# Altium footprint library CONN_W2B.PcbLib: 77 footprints (part 1 of 5)
Each footprint in its own frame and in the unit in brackets; x right, y up, seen from the top. Pads: shape width x height; smd on the part's side, far side on the other; paste and mask are expansions set on the pad; w line width, h text height; cw(c..) or ccw(c..) is an arc to the next point about the centre after c.
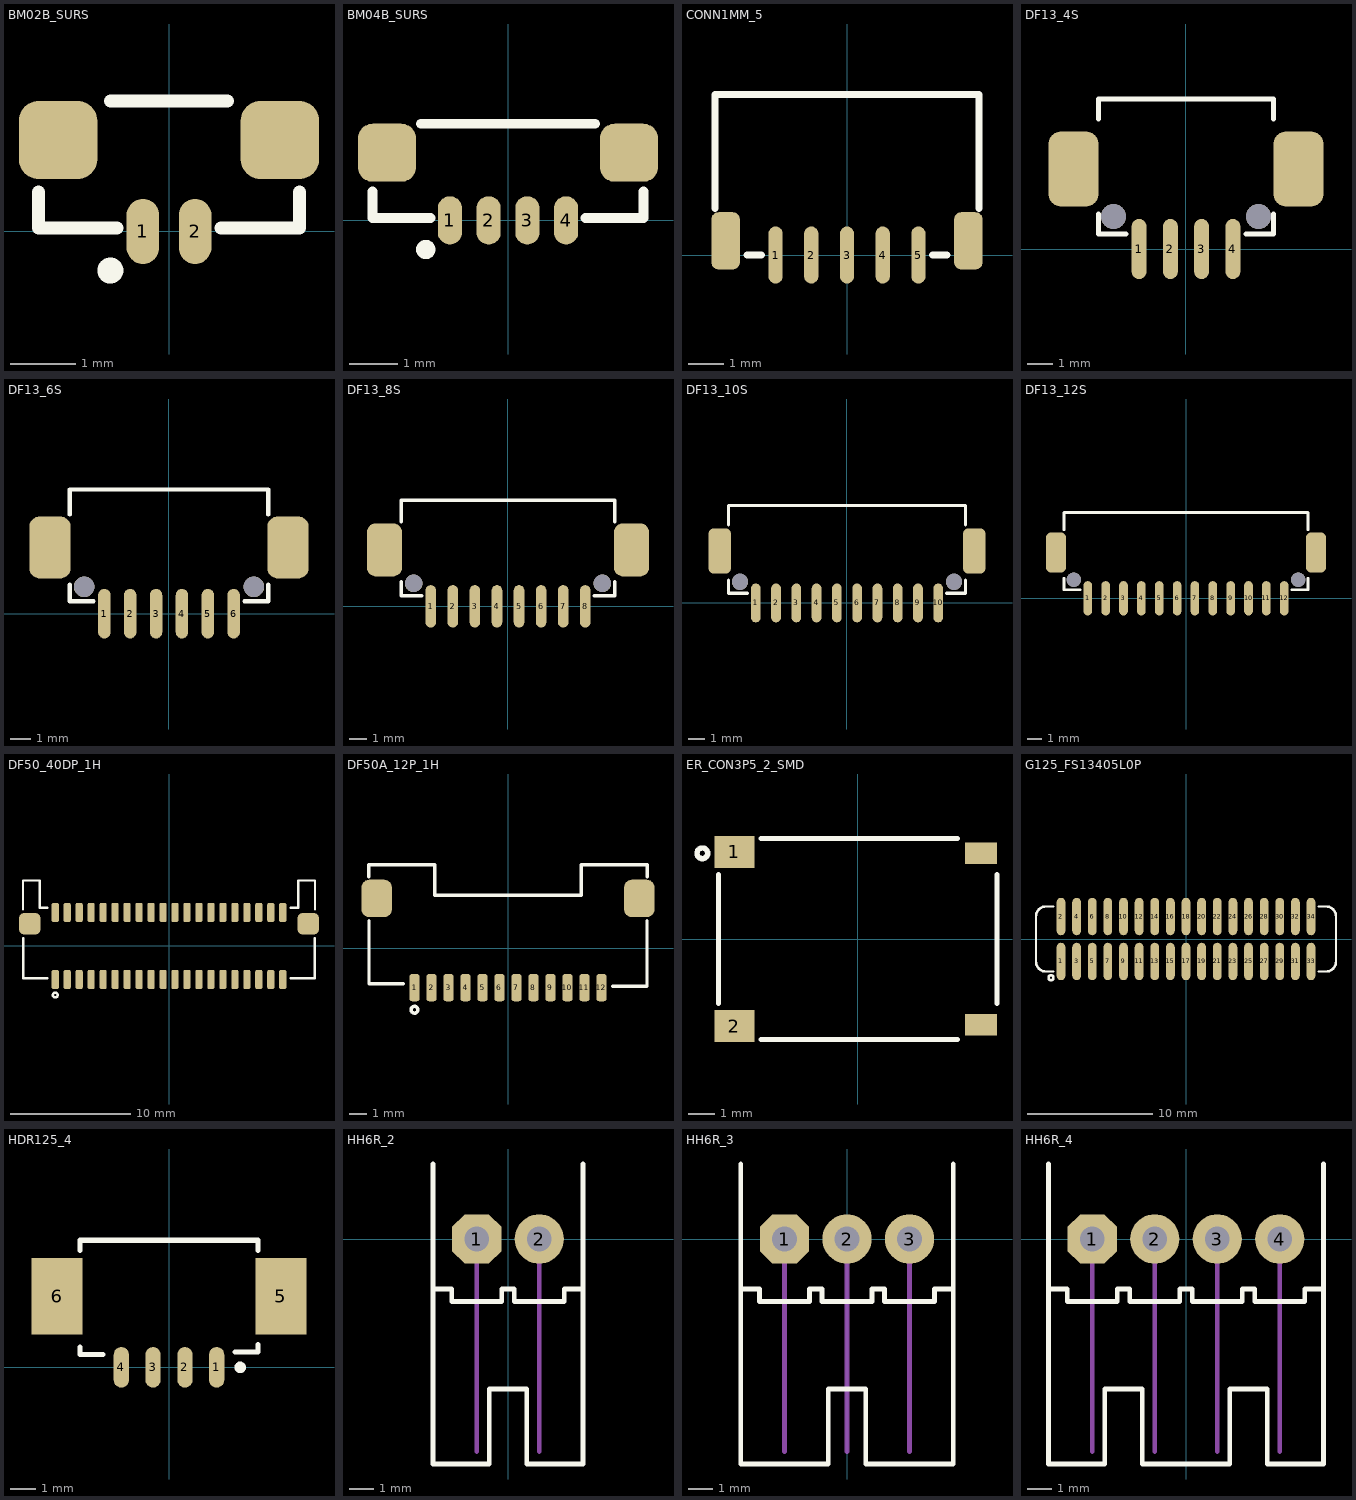
[diagram p0: the footprints below, top view; thin cyan lines are the x and y axes]

## BM02B_SURS [mm] "eSUR, Pitch: 0.8mm, Top Entry"
height 4
pads (4):
  oval 0.5x1 smd mask+0.075: 1(-0.4,0) 2(0.4,0)
  rrect50% 1.2x1.2 smd: ""(-1.7,1.4) ""(1.7,1.4)
Top Overlay:
  circle w0.2: c-0.9,-0.6 r0.1
  lines w0.2: -2,0.6 -2,0.05 -0.8,0.05 ; -0.9,2 0.9,2 ; 0.8,0.05 2,0.05 2,0.6
3D body "BM02B-SURS-TF.STEP": height 2.75, standoff 0, extent -1.9,-0.3 1.9,1.95

## BM04B_SURS [mm] "eSUR, Pitch: 0.8mm, Top Entry"
height 4
pads (6):
  oval 0.5x1 smd mask+0.075: 1(-1.2,0) 2(-0.4,0) 3(0.4,0) 4(1.2,0)
  rrect50% 1.2x1.2 smd: ""(-2.5,1.4) ""(2.5,1.4)
Top Overlay:
  circle w0.2: c-1.7,-0.6 r0.1
  lines w0.2: -2.8,0.6 -2.8,0.05 -1.6,0.05 ; -1.8,2 1.8,2 ; 1.6,0.05 2.8,0.05 2.8,0.6
3D body "BM04B-SURS-TF.STEP": height 2.75, standoff 0, extent -2.7,-0.3 2.7,1.95

## CONN1MM_5 [mm] "CONN, 1mm, SMT RA, TE 1734709-5"
height 3
pads (7):
  oval 0.4x1.6 smd: 1(-2,0) 2(-1,0) 3(0,0) 4(1,0) 5(2,0)
  rrect50% 0.8x1.6 smd: ""(-3.4,0.4) ""(3.4,0.4)
Top Overlay:
  lines w0.2: -3.7,1.3 -3.7,4.5 3.7,4.5 3.7,1.3 ; -2.8,0 -2.4,0 ; 2.4,0 2.8,0
3D body "c-1734709-5-b-3d.stp": height 2.95, standoff 0, extent -3.65,-0.55 3.65,4.4

## DF13_4S [mm] "Hirose Connector DF13-4P-1.25H, DF13 4WAY pitch:1.25mm"
height 3
pads (8):
  oval 0.6x2.4 smd: 1(-1.875,0) 2(-0.625,0) 3(0.625,0) 4(1.875,0)
  rrect50% 2x3 smd: ""(-4.5,3.2) ""(4.5,3.2)
  round 1 hole 1 unplated: ""(-2.9,1.3) ""(2.9,1.3)
Top Overlay:
  lines w0.2: -3.5,1.4 -3.5,0.6 -2.4,0.6 ; -3.5,5.2 -3.5,6 3.5,6 3.5,5.2 ; 2.4,0.6 3.5,0.6 3.5,1.4
3D body "DF13_4WAY.stp": height 3.58, standoff -0.82, extent -4.825,-0.6 4.825,5.9

## DF13_6S [mm] "Hirose Connector DF13-6P-1.25H, DF13 6WAY pitch:1.25mm"
height 3
pads (10):
  oval 0.6x2.4 smd: 1(-3.125,0) 2(-1.875,0) 3(-0.625,0) 4(0.625,0) 5(1.875,0) 6(3.125,0)
  rrect50% 2x3 smd: ""(-5.75,3.2) ""(5.75,3.2)
  round 1 hole 1 unplated: ""(-4.1,1.3) ""(4.1,1.3)
Top Overlay:
  lines w0.2: -4.8,1.4 -4.8,0.6 -3.65,0.6 ; -4.8,4.8 -4.8,6 4.8,6 4.8,4.8 ; 3.65,0.6 4.8,0.6 4.8,1.4
3D body "DF13_6WAY.stp": height 3.58, standoff -0.82, extent -6.075,-0.6 6.075,5.9

## DF13_8S [mm] "Hirose Connector DF13-8P-1.25H, pitch:1.25mm"
height 3
pads (12):
  oval 0.6x2.4 smd: 1(-4.375,0) 2(-3.125,0) 3(-1.875,0) 4(-0.625,0) 5(0.625,0) 6(1.875,0) 7(3.125,0) 8(4.375,0)
  rrect50% 2x3 smd: ""(-7,3.2) ""(7,3.2)
  round 1 hole 1 unplated: ""(-5.35,1.3) ""(5.35,1.3)
Top Overlay:
  lines w0.2: -6.05,1.4 -6.05,0.6 -4.9,0.6 ; -6.05,4.8 -6.05,6 6.05,6 6.05,4.8 ; 4.9,0.6 6.05,0.6 6.05,1.4
3D body "DF13-8P-1.25H.stp": height 3.58, standoff -0.82, extent -7.325,-0.6 7.325,5.9

## DF13_10S [mm] "Hirose Connector DF13-12P-1.25H, pitch:1.25mm"
height 3
pads (14):
  oval 0.6x2.4 smd: 1(-5.625,0) 2(-4.375,0) 3(-3.125,0) 4(-1.875,0) 5(-0.625,0) 6(0.625,0) 7(1.875,0) 8(3.125,0) 9(4.375,0) 10(5.625,0)
  rrect50% 1.4x2.8 smd: ""(-7.85,3.2) ""(7.85,3.2)
  round 1 hole 1 unplated: ""(-6.6,1.3) ""(6.6,1.3)
Top Overlay:
  lines w0.2: -7.3,1.4 -7.3,0.6 -6.15,0.6 ; -7.3,4.8 -7.3,6 7.3,6 7.3,4.8 ; 6.15,0.6 7.3,0.6 7.3,1.4
3D body "DF13-10P-1.25H.stp": height 3.58, standoff -0.82, extent -8.575,-0.6 8.575,5.9

## DF13_12S [mm] "Hirose Connector DF13-12P-1.25H, pitch:1.25mm"
height 3
pads (16):
  oval 0.6x2.4 smd: 1(-6.875,0) 2(-5.625,0) 3(-4.375,0) 4(-3.125,0) 5(-1.875,0) 6(-0.625,0) 7(0.625,0) 8(1.875,0) 9(3.125,0) 10(4.375,0) 11(5.625,0) 12(6.875,0)
  rrect50% 1.4x2.8 smd: ""(-9.1,3.2) ""(9.1,3.2)
  round 1 hole 1 unplated: ""(-7.85,1.3) ""(7.85,1.3)
Top Overlay:
  lines w0.2: -8.55,1.4 -8.55,0.6 -7.4,0.6 ; -8.55,4.8 -8.55,6 8.55,6 8.55,4.8 ; 7.4,0.6 8.55,0.6 8.55,1.4
3D body "DF13-12P-1.25H.stp": height 3.58, standoff -0.82, extent -9.825,-0.6 9.825,5.9

## DF50_40DP_1H [mm] "DF50-40DP-1H(51)"
height 1.6
pads (42):
  rrect50% 0.6x1.6 smd: 1(-9.5,-2.8) 2(-9.5,2.8) 3(-8.5,-2.8) 4(-8.5,2.8) 5(-7.5,-2.8) 6(-7.5,2.8) 7(-6.5,-2.8) 8(-6.5,2.8) 9(-5.5,-2.8) 10(-5.5,2.8) 11(-4.5,-2.8) 12(-4.5,2.8) 13(-3.5,-2.8) 14(-3.5,2.8) 15(-2.5,-2.8) 16(-2.5,2.8) 17(-1.5,-2.8) 18(-1.5,2.8) 19(-0.5,-2.8) 20(-0.5,2.8) 21(0.5,-2.8) 22(0.5,2.8) 23(1.5,-2.8) 24(1.5,2.8) 25(2.5,-2.8) 26(2.5,2.8) 27(3.5,-2.8) 28(3.5,2.8) 29(4.5,-2.8) 30(4.5,2.8) 31(5.5,-2.8) 32(5.5,2.8) 33(6.5,-2.8) 34(6.5,2.8) 35(7.5,-2.8) 36(7.5,2.8) 37(8.5,-2.8) 38(8.5,2.8) 39(9.5,-2.8) 40(9.5,2.8)
  rrect50% 1.8x1.8 smd: ""(-11.625,1.85) ""(11.625,1.85)
Top Overlay:
  circle w0.2: c-9.5,-4.1 r0.2
  lines w0.2: -12.192,3.048 -12.192,5.461 -10.795,5.461 -10.795,3.175 -10.16,3.175 ; -12.175,0.635 -12.175,-2.71 -10.16,-2.71 ; 10.16,-2.71 12.175,-2.71 12.175,0.635 ; 10.16,3.175 10.795,3.175 10.795,5.461 12.192,5.461 12.192,3.048
3D body "DF50-40DP-1H.stp": height 9.01, standoff 0.01, extent -12.175,-3.218 12.175,5.442

## DF50A_12P_1H [mm] "DF50A-12P-1H(51), 1mm pitch"
pads (14):
  rrect50% 0.6x1.6 smd: 1(-5.5,-2.325) 2(-4.5,-2.325) 3(-3.5,-2.325) 4(-2.5,-2.325) 5(-1.5,-2.325) 6(-0.5,-2.325) 7(0.5,-2.325) 8(1.5,-2.325) 9(2.5,-2.325) 10(3.5,-2.325) 11(4.5,-2.325) 12(5.5,-2.325)
  rrect50% 1.8x2.2 smd: ""(-7.725,2.925) ""(7.725,2.925)
Top Overlay:
  circle w0.2: c-5.5,-3.625 r0.2
  lines w0.2: -8.192,4.2 -8.192,4.9 -4.3,4.9 -4.3,3.1 4.3,3.1 4.3,4.9 8.192,4.9 8.192,4.2 ; -8.175,1.6 -8.175,-2.1 -6.16,-2.1 ; 6.16,-2.235 8.175,-2.235 8.175,1.6
3D body "DF50A-12P-1H.stp": height 6.07, standoff -0.01, extent -8.405,-2.8 8.405,4.8

## ER_CON3P5_2_SMD [mm] "ER-CON3.5-2P-SMD"
pads (4):
  rect 1.5x1.2 smd: 1(-4.6,3.25) 2(-4.6,-3.25)
  rect 1.2x0.8 smd: ""(4.6,-3.2) ""(4.6,3.2)
Top Overlay:
  circle w0.2: c-5.8,3.2 r0.2
  lines w0.2: -5.2,-2.4 -5.2,2.4 ; -3.6,-3.75 3.717,-3.75 ; -3.6,3.75 3.717,3.75 ; 5.2,-2.4 5.2,2.4
3D body: height 3.65, standoff 0, extent -5.25,-3.725 5.25,3.725

## G125_FS13405L0P [mm] "G125-FS13405L0P Harwin Gecko 1.25mm Female"
pads (34):
  oval 0.7x3 smd: 1(-10,-1.8) 2(-10,1.8) 3(-8.75,-1.8) 4(-8.75,1.8) 5(-7.5,-1.8) 6(-7.5,1.8) 7(-6.25,-1.8) 8(-6.25,1.8) 9(-5,-1.8) 10(-5,1.8) 11(-3.75,-1.8) 12(-3.75,1.8) 13(-2.5,-1.8) 14(-2.5,1.8) 15(-1.25,-1.8) 16(-1.25,1.8) 17(0,-1.8) 18(0,1.8) 19(1.25,-1.8) 20(1.25,1.8) 21(2.5,-1.8) 22(2.5,1.8) 23(3.75,-1.8) 24(3.75,1.8) 25(5,-1.8) 26(5,1.8) 27(6.25,-1.8) 28(6.25,1.8) 29(7.5,-1.8) 30(7.5,1.8) 31(8.75,-1.8) 32(8.75,1.8) 33(10,-1.8) 34(10,1.8)
Top Overlay:
  circle w0.2: c-10.8,-3.1 r0.2
  lines w0.2: -10.6,-2.6 -11.2,-2.6 cw(c-11.2,-1.8) -12,-1.8 -12,1.8 cw(c-11.2,1.8) -11.2,2.6 -10.6,2.6 ; 10.6,-2.6 11.2,-2.6 ccw(c11.2,-1.8) 12,-1.8 12,1.8 ccw(c11.2,1.8) 11.2,2.6 10.6,2.6
3D body "g125-fs13405l0_asm.stp": height 5.3, standoff -0.03, extent -11.9,-2.897 11.9,2.897

## HDR125_4 [mm] "CONN, HEADER, 1.25mm PITCH, MOLEX PicoBlade 0532610471"
pads (6):
  oval 0.6x1.6 smd: 1(1.875,0) 2(0.625,0) 3(-0.625,0) 4(-1.875,0)
  rect 2x3 smd: 5(4.4,2.8) 6(-4.4,2.8)
Top Overlay:
  circle w0.254: c2.8,0 r0.1
  lines w0.2: -3.5,0.8 -3.5,0.5 -2.6,0.5 ; -3.5,4.6 -3.5,5 3.5,5 3.5,4.6 ; 2.6,0.6 3.5,0.6 3.5,0.9
Mechanical 29:
  text ".Designator" at 3.6,-2.2 h1.52
3D body "532610471.stp": height 3.39, standoff -0.01, extent -5.075,-0.3 5.075,4.9

## HH6R_2 [mm]
pads (2):
  oct 2x2 hole 1: 1(-1.27,0)
  round 2 hole 1: 2(1.27,0)
Top Overlay:
  lines w0.2: -3.048,3.048 -3.048,-2.032 ; 3.048,3.048 3.048,-2.032 ; -3.048,-2.032 -3.048,-9.144 -0.762,-9.144 -0.762,-6.096 0.762,-6.096 0.762,-9.144 3.048,-9.144 3.048,-2.032 ; -3.048,-2.032 -2.286,-2.032 -2.286,-2.54 -0.254,-2.54 -0.254,-2.032 0.254,-2.032 0.254,-2.54 2.286,-2.54 2.286,-2.032 3.048,-2.032
Mechanical 5:
  lines w0.2: -1.27,-8.636 -1.27,0 ; 1.27,-8.636 1.27,0

## HH6R_3 [mm]
pads (3):
  oct 2x2 hole 1: 1(-2.54,0)
  round 2 hole 1: 2(0,0) 3(2.54,0)
Top Overlay:
  lines w0.2: -4.318,3.048 -4.318,-2.032 ; 4.318,3.048 4.318,-2.032 ; -4.318,-2.032 -3.556,-2.032 -3.556,-2.54 -1.524,-2.54 -1.524,-2.032 -1.016,-2.032 -1.016,-2.54 1.016,-2.54 1.016,-2.032 1.524,-2.032 1.524,-2.54 3.556,-2.54 3.556,-2.032 4.318,-2.032 ; -4.318,-2.032 -4.318,-9.144 -0.762,-9.144 -0.762,-6.096 0.762,-6.096 0.762,-9.144 4.318,-9.144 4.318,-2.032
Mechanical 5:
  lines w0.2: -2.54,-8.636 -2.54,0 ; 0,-8.636 0,0 ; 2.54,-8.636 2.54,0

## HH6R_4 [mm]
pads (4):
  oct 2x2 hole 1: 1(-3.81,0)
  round 2 hole 1: 2(-1.27,0) 3(1.27,0) 4(3.81,0)
Top Overlay:
  lines w0.2: -5.588,3.048 -5.588,-2.032 ; 5.588,3.048 5.588,-2.032 ; -5.588,-2.032 -4.826,-2.032 -4.826,-2.54 -2.794,-2.54 -2.794,-2.032 -2.286,-2.032 -2.286,-2.54 -0.254,-2.54 -0.254,-2.032 0.254,-2.032 0.254,-2.54 2.286,-2.54 2.286,-2.032 2.794,-2.032 2.794,-2.54 4.826,-2.54 4.826,-2.032 5.588,-2.032 ; -5.588,-2.032 -5.588,-9.144 -3.302,-9.144 -3.302,-6.096 -1.778,-6.096 -1.778,-9.144 1.778,-9.144 1.778,-6.096 3.302,-6.096 3.302,-9.144 5.588,-9.144 5.588,-2.032
Mechanical 5:
  lines w0.2: -3.81,-8.636 -3.81,0 ; -1.27,-8.636 -1.27,0 ; 1.27,-8.636 1.27,0 ; 3.81,-8.636 3.81,0